# Altium footprint library chipfc_libs.PCBLIB: 391 footprints (part 19 of 25)
Each footprint in its own frame and in the unit in brackets; x right, y up, seen from the top. Pads: shape width x height; smd on the part's side, far side on the other; paste and mask are expansions set on the pad; w line width, h text height; cw(c..) or ccw(c..) is an arc to the next point about the centre after c.
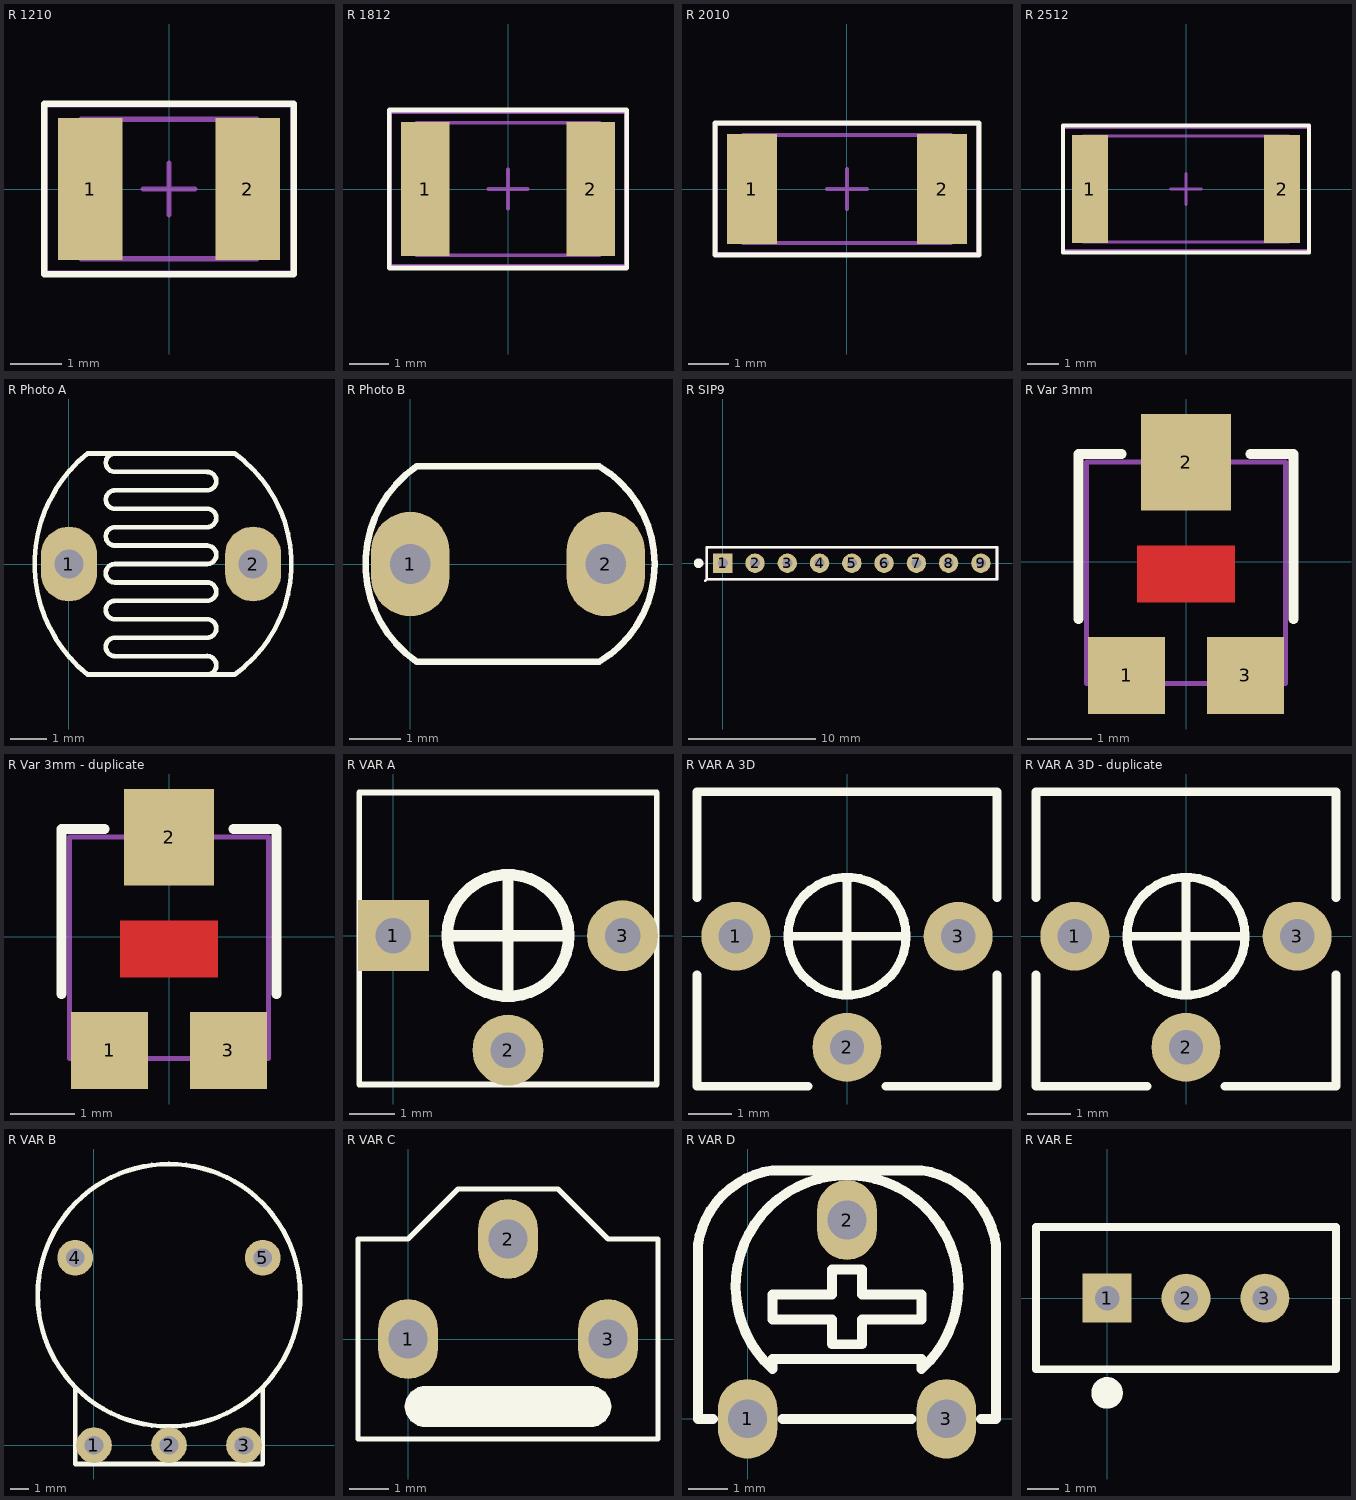
[diagram p18: the footprints below, top view; thin cyan lines are the x and y axes]

## R 1210 [mm] "Chip Resistor, 2-Leads, Body 3.2x2.5mm, IPC Medium Density"
height 0.7
pads (2):
  rect 1.25x2.75 smd: 1(-1.525,0) 2(1.525,0)
Top Overlay:
  lines w0.127: -2.413,-1.651 2.413,-1.651 2.413,1.651 -2.413,1.651 -2.413,-1.651
Mechanical 13:
  lines w0.1: -1.7,-1.35 1.7,-1.35 1.7,1.35 -1.7,1.35 -1.7,-1.35
Mechanical 15:
  lines w0.1: -0.5,0 0.5,0 ; 0,-0.5 0,0.5 ; -2.4,-1.625 2.4,-1.625 2.4,1.625 -2.4,1.625 -2.4,-1.625
3D body "User Library-Chip Resistor2.step": height 0.7, standoff 0, extent -1.6,-1.25 1.6,1.25

## R 1812 [mm] "Chip Resistor, 2-Leads, Body 4.5x3.2mm, IPC Medium Density"
height 0.7
pads (2):
  rect 1.25x3.45 smd: 1(-2.125,0) 2(2.125,0)
Top Overlay:
  lines w0.127: -3.048,-2.032 -3.048,2.032 3.048,2.032 3.048,-2.032 -3.048,-2.032
Mechanical 13:
  lines w0.1: -2.35,-1.7 2.35,-1.7 2.35,1.7 -2.35,1.7 -2.35,-1.7
Mechanical 15:
  lines w0.1: -0.5,0 0.5,0 ; 0,-0.5 0,0.5 ; -3.025,-1.975 3.025,-1.975 3.025,1.975 -3.025,1.975 -3.025,-1.975
3D body "User Library-Chip Resistor2 (1).step": height 0.7, standoff 0, extent -2.25,-1.6 2.25,1.6

## R 2010 [mm] "Chip Resistor, 2-Leads, Body 5.0x2.5mm, IPC Medium Density"
height 0.8
pads (2):
  rect 1.25x2.75 smd: 1(-2.375,0) 2(2.375,0)
Top Overlay:
  lines w0.127: -3.302,-1.651 -3.302,1.651 3.302,1.651 3.302,-1.651 -3.302,-1.651
Mechanical 13:
  lines w0.1: -2.6,-1.35 -2.6,1.35 2.6,1.35 2.6,-1.35 -2.6,-1.35
Mechanical 15:
  lines w0.1: -0.5,0 0.5,0 ; 0,-0.5 0,0.5 ; -3.275,-1.625 -3.275,1.625 3.275,1.625 3.275,-1.625 -3.275,-1.625
3D body "User Library-Chip Resistor2 (2).step": height 0.7, standoff 0, extent -2.5,-1.25 2.5,1.25

## R 2512 [mm] "Chip Resistor, 2-Leads, Body 6.4x3.2mm, IPC Medium Density"
height 0.8
pads (2):
  rect 1.15x3.45 smd: 1(-3.075,0) 2(3.075,0)
Top Overlay:
  lines w0.127: -3.937,-2.032 -3.937,2.032 3.937,2.032 3.937,-2.032 -3.937,-2.032
Mechanical 13:
  lines w0.1: -3.3,-1.7 3.3,-1.7 3.3,1.7 -3.3,1.7 -3.3,-1.7
Mechanical 15:
  lines w0.1: -0.5,0 0.5,0 ; 0,-0.5 0,0.5 ; -3.925,-1.975 3.925,-1.975 3.925,1.975 -3.925,1.975 -3.925,-1.975
3D body "User Library-Chip Resistor2 (3).step": height 0.76, standoff 0, extent -3.2,-1.6 3.2,1.6

## R Photo A [mil] "Photoresistor"
pads (2):
  oval 60x80 / inner round 62 / far side oval 60x80 hole 31: 1(0,0) 2(196.83,0)
Top Overlay:
  lines w5: 49.2,-78.73 147.62,-78.73 ccw(c147.62,-68.88) 147.62,-59.03 49.2,-59.05 cw(c49.2,-49.2) 49.2,-39.35 147.62,-39.37 ccw(c147.62,-29.52) 147.62,-19.67 ; 49.2,-78.72 ccw(c49.2,-88.57) 49.2,-98.42 147.62,-98.42 cw(c147.62,-108.25) 147.62,-118.1 ; 49.2,78.72 ccw(c49.2,68.88) 49.2,59.05 147.62,59.05 cw(c147.62,49.2) 147.62,39.37 49.2,39.37 ccw(c49.2,29.52) 49.2,19.68 147.62,19.68 ; 49.2,78.73 147.62,78.73 ccw(c147.62,88.57) 147.62,98.4 49.2,98.42 cw(c49.2,108.25) 49.2,118.08 ; 147.62,-19.68 49.2,-19.68 cw(c49.2,-9.83) 49.2,0.02 147.62,0 ccw(c147.62,9.83) 147.62,19.67 ; 19.68,-118.12 cw(c115.25,0) 19.68,118.12 177.15,118.12 cw(c92.13,0) 177.15,-118.12 19.68,-118.12

## R Photo B [mil] "Photoresistor"
pads (2):
  oval 60x80 / inner round 62 / far side oval 60x80 hole 31: 1(0,0) 2(150,0)
Top Overlay:
  lines w5: 5,-75 cw(c57.08,0) 5,75 145,75 cw(c100,0) 145,-75 5,-75

## R SIP9 [mil]
pads (9):
  rect 60x60 / inner round 60 / far side rect 60x80 hole 31: 1(0,0)
  round 60 / inner round 60 / far side oval 60x80 hole 31: 2(100,0) 3(200,0) 4(300,0) 5(400,0) 6(500,0) 7(600,0) 8(700,0) 9(800,0)
Top Overlay:
  circle w20: c-75,0 r5
  lines w8: -55,-55 -50,-50 ; -50,-50 -50,50 850,50 850,-50 -50,-50
Mechanical 1:
  lines w8: -55,-55 -50,-50 ; -50,-50 -50,50 850,50 850,-50 -50,-50

## R Var 3mm [mm]
pads (3):
  rect 1.2x1.2 smd: 1(-0.925,-1.775) 3(0.925,-1.775)
  rect 1.4x1.5 smd: 2(0,1.55)
Top Layer:
  rectangle: -0.762,-0.635 0.762,0.254
Top Overlay:
  lines w0.152: -1.675,-0.9 -1.675,1.675 -1,1.675 ; 1,1.675 1.675,1.675 1.675,-0.9
Mechanical 15:
  lines w0.076: -1.55,-1.9 1.55,-1.9 1.55,1.55 -1.55,1.55 -1.55,-1.9 ; -1.4,-1.9 -0.45,-1.9 -0.45,-1.3 -1.4,-1.3 -1.4,-1.9 ; -0.6,0.9 0.6,0.9 0.6,1.85 -0.6,1.85 -0.6,0.9 ; 0.45,-1.9 1.4,-1.9 1.4,-1.3 0.45,-1.3 0.45,-1.9
3D body "User Library-PVZ3A.STEP": height 1.95, standoff 0, extent -1.55,-1.85 1.55,1.84

## R Var 3mm - duplicate [mm]
pads (3):
  rect 1.2x1.2 smd: 1(-0.925,-1.775) 3(0.925,-1.775)
  rect 1.4x1.5 smd: 2(0,1.55)
Top Layer:
  rectangle: -0.762,-0.635 0.762,0.254
Top Overlay:
  lines w0.152: -1.675,-0.9 -1.675,1.675 -1,1.675 ; 1,1.675 1.675,1.675 1.675,-0.9
Mechanical 15:
  lines w0.076: -1.55,-1.9 1.55,-1.9 1.55,1.55 -1.55,1.55 -1.55,-1.9 ; -1.4,-1.9 -0.45,-1.9 -0.45,-1.3 -1.4,-1.3 -1.4,-1.9 ; -0.6,0.9 0.6,0.9 0.6,1.85 -0.6,1.85 -0.6,0.9 ; 0.45,-1.9 1.4,-1.9 1.4,-1.3 0.45,-1.3 0.45,-1.9
3D body "User Library-PVZ3A.STEP": height 1.95, standoff 0, extent -1.55,-1.85 1.55,1.84

## R VAR A [mil]
pads (3):
  rect 62x62 hole 31: 1(0,0)
  round 62 hole 31: 2(100,-100) 3(200,0)
Top Overlay:
  circle w10: c100,0 r53.15
  lines w5: -30,-130 -30,125 230,125 230,-130 -30,-130
  lines w10: 50,0 150,0 ; 100,-50 100,50

## R VAR A 3D [mil]
pads (3):
  round 62 hole 31: 1(-100,0) 2(0,-100) 3(100,0)
Top Overlay:
  circle w8: c0,0 r53.15
  lines w8: -135,-35 -135,-135 -35,-135 ; -135,35 -135,130 135,130 135,35 ; -50,0 50,0 ; 0,-50 0,50 ; 35,-135 135,-135 135,-35
3D body "User Library-Bien_tro_xanh_ResPVC6a.step": height 204.72, standoff -118.11, extent -135.83,-136.17 135.83,136.23

## R VAR A 3D - duplicate [mil]
pads (3):
  round 62 hole 31: 1(-100,0) 2(0,-100) 3(100,0)
Top Overlay:
  circle w8: c0,0 r53.15
  lines w8: -135,-35 -135,-135 -35,-135 ; -135,35 -135,130 135,130 135,35 ; -50,0 50,0 ; 0,-50 0,50 ; 35,-135 135,-135 135,-35
3D body "User Library-Bien_tro_xanh_ResPVC6a.step": height 204.72, standoff -118.11, extent -135.83,-136.17 135.83,136.23

## R VAR B [mil]
pads (5):
  round 75 / inner round 60 / far side round 75 hole 39: 1(0,0) 2(157.47,0) 3(314.93,0) 4(-39.37,393.67) 5(354.3,393.67)
Top Overlay:
  circle w10: c157.47,314.93 r275.57
  lines w10: -39.37,118.1 -39.37,-39.37 354.3,-39.37 354.3,118.1

## R VAR C [mil]
pads (3):
  oval 60x80 / inner round 60 / far side oval 60x80 hole 39: 1(0,0) 2(100,100) 3(200,0)
Top Overlay:
  region: 185.15,-47.36 185.38,-47.3 185.45,-47.34 185.53,-47.32 189.93,-48.19 190.37,-48.49 190.9,-48.6 196.75,-52.51 197.05,-52.95 197.49,-53.25 201.4,-59.1 201.51,-59.63 201.81,-60.07 203.18,-66.97 203.07,-67.5 203.18,-68.03 201.81,-74.93 201.51,-75.37 201.4,-75.9 197.49,-81.75 197.05,-82.05 196.75,-82.49 190.9,-86.4 190.37,-86.51 189.93,-86.81 185.53,-87.68 185.26,-87.63 185,-87.73 15,-87.71 14.85,-87.64 14.62,-87.7 14.55,-87.66 14.47,-87.68 10.07,-86.81 9.63,-86.51 9.1,-86.4 3.25,-82.49 2.95,-82.05 2.51,-81.75 -1.4,-75.9 -1.51,-75.37 -1.81,-74.93 -3.18,-68.03 -3.07,-67.5 -3.18,-66.97 -1.81,-60.07 -1.51,-59.63 -1.4,-59.1 2.51,-53.25 2.95,-52.95 3.25,-52.51 9.1,-48.6 9.63,-48.49 10.07,-48.19 14.47,-47.32 14.55,-47.34 14.62,-47.3 14.85,-47.36 15,-47.29 185,-47.29
  lines w5: -50,-100 250,-100 250,100 200,100 150,150 50,150 0,100 -50,100 -50,-100

## R VAR D [mil]
pads (3):
  oval 60x80 / inner round 60 / far side oval 60x80 hole 39: 1(0,0) 2(100,200) 3(200,0)
Top Overlay:
  lines w10: -35,0 -50,0 -50,175 cw(c37.5,162.5) 25,250 175,250 cw(c162.5,162.5) 250,175 250,0 235,0 ; 35,0 165,0 ; 25,50 cw(c100,133.13) 175,50 175,60 25,60 25,50 ; 25,100 25,125 85,125 85,150 115,150 115,125 175,125 175,100 115,100 115,75 85,75 85,100 25,100

## R VAR E [mil]
pads (3):
  rect 62x62 hole 31: 1(0,0)
  round 62 hole 31: 2(100,0) 3(200,0)
Top Overlay:
  circle w20: c0,-120 r10
  lines w10: -90,-90 -90,90 290,90 290,-90 -90,-90
3D body "User Library-67W.step": height 459.45, standoff -181.1, extent -92.91,-97.43 292.92,97.45